# Altium footprint library 方林 封装库.PcbLib: 101 footprints (part 6 of 7)
Each footprint in its own frame and in the unit in brackets; x right, y up, seen from the top. Pads: shape width x height; smd on the part's side, far side on the other; paste and mask are expansions set on the pad; w line width, h text height; cw(c..) or ccw(c..) is an arc to the next point about the centre after c.
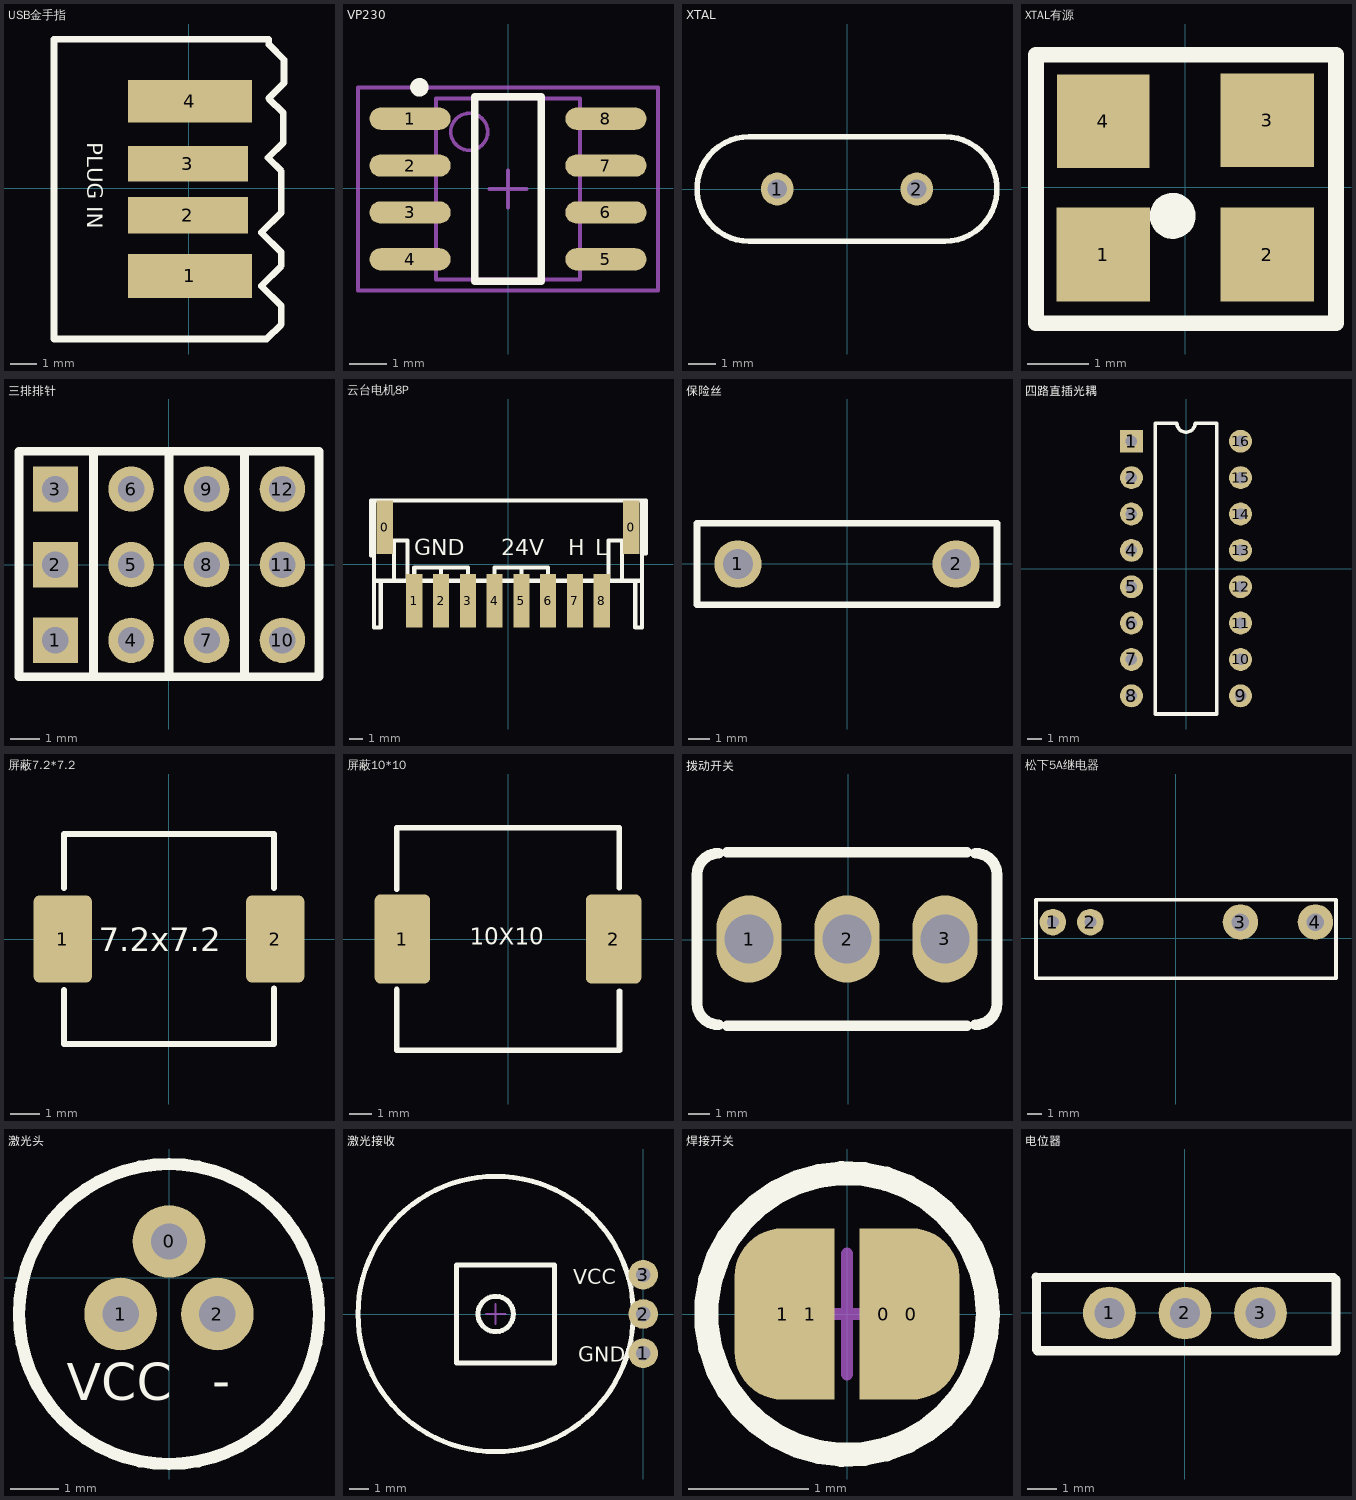
[diagram p5: the footprints below, top view; thin cyan lines are the x and y axes]

## USB金手指 [mil]
pads (4):
  rect 186x66 smd: 1(1.5,-131)
  rect 180x55 smd: 2(-1.5,-40)
  rect 180x53 smd: 3(-1.5,37)
  rect 186x63.58 smd: 4(1.5,131)
Top Overlay:
  lines w10: -202.13,-225.53 -202.13,223.69 119.81,223.69 119.81,215.69 142.5,193 142.5,158 119.5,135 141.5,113 141.5,69 118.5,46 138.5,26 138.5,-36 108.5,-66 138.5,-96 138.5,-116 108.5,-146 138.5,-176 138.5,-196 138.5,-203.53 116.5,-225.53 -201.5,-225.53
  text "PLUG IN" at -160.5,69 h40
3D body: height 11.81, standoff 0, extent -204.5,-228 139.5,-184
3D body: height 11.81, standoff -39.37, extent -203.5,186 145.5,223
3D body: height 39.37, standoff -15.75, extent -204.5,-228 146.5,223

## VP230 [mm]
pads (8):
  oval 2.2x0.6 smd: 1(-2.654,1.88) 2(-2.654,0.61) 3(-2.654,-0.66) 4(-2.654,-1.93) 5(2.654,-1.93) 6(2.654,-0.66) 7(2.654,0.61) 8(2.654,1.88)
Top Overlay:
  circle w0.25: c-2.4,2.73 r0.125
  lines w0.2: -0.9,-2.525 -0.9,2.475 0.9,2.475 0.9,-2.525 -0.9,-2.525
Mechanical 13:
  circle w0.1: c-1.05,1.525 r0.5
  lines w0.1: -1.95,-2.475 -1.95,2.425 1.95,2.425 1.95,-2.475 -1.95,-2.475
Mechanical 15:
  lines w0.1: -0.5,-0.025 0.5,-0.025 ; 0,-0.525 0,0.475 ; -4.064,-2.775 -4.064,2.725 4.064,2.725 4.064,-2.775 -4.064,-2.775
3D body "SO-8.STEP": height 1.7, standoff 0, extent -3,-2.476 3,2.425

## XTAL [mm]
pads (2):
  round 1.2 hole 0.7: 1(-2.54,0) 2(2.54,0)
Top Overlay:
  lines w0.203: -3.556,-1.905 cw(c-3.556,0) -3.556,1.905 3.556,1.905 cw(c3.556,0) 3.556,-1.905 -3.556,-1.905
3D body "CRYSTAL-HP49US.step": height 3.52, standoff -3.98, extent -5.7,-2.286 5.65,2.364

## XTAL有源 [mil]
pads (4):
  rect 60x60 smd: 1(-52.5,-43) 2(52.5,-43) 3(52.5,43)
  rect 59.05x60 smd: 4(-52.5,42.3)
Top Overlay:
  circle w16: c-7.98,-18.2 r6.65
  lines w9.84: -95.5,-87 96.5,-87 ; -95.5,85 96.5,85
  lines w10: -95.5,-87 -95.5,85 ; 96.5,-87 96.5,85
3D body: height 30, standoff 0, extent -95.48,-60.7 99.52,54.3

## 三排排针 [mil]
pads (12):
  rect 60x60 hole 35: 1(-150,-100) 2(-150,0) 3(-150,100)
  round 60 hole 35: 4(-50,-100) 5(-50,0) 6(-50,100) 7(50,-100) 8(50,0) 9(50,100) 10(150,-100) 11(150,0) 12(150,100)
Top Overlay:
  lines w11.81: -99.8,-147.24 -99.8,150 ; 0.1,-148.23 0.1,150 ; 100,-148.23 100,150 ; -198.23,-148.23 198.43,-148.23 198.43,150 -198.23,150 -198.23,-148.23

## 云台电机8P [mm]
pads (10):
  rect 1.2x4 smd: 0(-9.2,2.75) 0(9.2,2.75) 1(-7,-2.75) 2(-5,-2.75) 3(-3,-2.75) 4(-1,-2.75) 5(1,-2.75) 6(3,-2.75) 7(5,-2.75) 8(7,-2.75)
Top Overlay:
  lines w0.305: -10,0.59 -10.051,0.64 -10.227,0.64 -10.227,4.755 -9.648,4.755 ; -9.5,-1.25 -9.5,-4.75 -10,-4.75 -10,-1.25 ; -8.5,-1.25 -8.5,1.75 -7.5,1.75 -7.5,-1.25 ; -7,-1.25 -7,-0.25 -5,-0.25 ; -3,-1.25 -3,-0.25 -5,-0.25 ; -1,-1.25 -1,-0.25 1,-0.25 ; 1,-1.25 1,-0.25 ; 3,-1.25 3,-0.25 1,-0.25 ; 7.5,-1.25 7.5,1.75 8.5,1.75 8.5,-1.25 ; 9.301,4.73 10.296,4.73 10.296,0.793 10.025,0.793 10,0.767 ; 9.5,-1.25 9.5,-4.75 10,-4.75 10,-1.25 ; -10,-1.25 10,-1.25 ; -10,-1.25 -10,4.75 10,4.75 10,-1.25 ; -5,-0.25 -5,-1.25 -5,-0.25
  text "GND" at -7,0.25 h2.03
  text "24V" at -0.5,0.25 h2.03
  text "H" at 4.5,0.25 h2.03
  text "L" at 6.5,0.25 h2.03
3D body: height 2.34, standoff 0, extent 9.728,0.691 10.719,4.603
3D body: height 2.34, standoff 0, extent -10.465,0.615 -9.449,4.654
3D body: height 5.54, standoff 0, extent -8.509,-1.341 -7.442,1.783
3D body: height 5.54, standoff 0, extent 7.544,-1.315 8.56,1.86
3D body: height 2.5, standoff 0, extent 9.55,-4.694 10.058,-1.315
3D body: height 2.5, standoff 0, extent -10.109,-4.77 -9.449,-1.341
3D body: height 5.53, standoff 0, extent -10.109,-1.366 10.058,4.704

## 保险丝 [mm]
pads (2):
  round 2.2 hole 1.397: 1(-5.08,0) 2(5.08,0)
Top Overlay:
  lines w0.305: -6.985,-1.905 -6.985,1.905 6.985,1.905 6.985,-1.905 -6.985,-1.905

## 四路直插光耦 [mm]
pads (16):
  rect 1.6x1.6 hole 0.8: 1(-3.81,8.89)
  round 1.6 hole 0.8: 2(-3.81,6.35) 3(-3.81,3.81) 4(-3.81,1.27) 5(-3.81,-1.27) 6(-3.81,-3.81) 7(-3.81,-6.35) 8(-3.81,-8.89) 9(3.81,-8.89) 10(3.81,-6.35) 11(3.81,-3.81) 12(3.81,-1.27) 13(3.81,1.27) 14(3.81,3.81) 15(3.81,6.35) 16(3.81,8.89)
Top Overlay:
  lines w0.254: -2.159,-10.16 -2.159,10.16 -0.635,10.16 ccw(c0,10.16) 0.635,10.16 2.159,10.16 2.159,-10.16 -2.159,-10.16

## 屏蔽7.2*7.2 [mm]
pads (2):
  rrect20% 2x3 smd: 1(-3.65,0) 2(3.65,0)
Top Overlay:
  lines w0.2: -3.6,-1.75 -3.6,-3.6 3.6,-3.6 3.6,-1.7 ; -3.6,1.75 -3.6,3.6 1.9,3.6 3.6,3.6 3.6,1.75
  text "7.2x7.2" at -2.417,-0.412 h0.81
3D body: height 4, standoff 0.5, extent -3.575,-3.6 3.588,3.588

## 屏蔽10*10 [mm]
pads (2):
  rrect20% 2.5x4 smd: 1(-4.75,0) 2(4.75,0)
Top Overlay:
  lines w0.254: -5,-2.27 -5,-5 5.016,-5 5.016,-2.349 ; -5,2.239 -5,5 5,5 5,2.302
  text "10X10" at -1.719,-0.269 h0.76
3D body: height 5, standoff 0.5, extent -4.978,-4.978 5.004,4.953

## 拨动开关 [mil] "扭子拨动开关"
pads (3):
  oval 120x160 hole 90.55: 1(-182,1) 2(-2,1) 3(178,1)
Top Overlay:
  lines w20: -238.22,-156.48 cw(c-238.22,-117.11) -277.59,-117.11 -277.59,119.11 cw(c-238.22,119.11) -238.22,158.48 ; -222,-158.37 218,-158.37 ; -222,160.37 218,160.37 ; 234.22,-156.48 ccw(c234.22,-117.11) 273.59,-117.11 273.59,119.11 ccw(c234.22,119.11) 234.22,158.48
3D body: height 748.03, standoff 0, extent -41.06,-38.29 37.37,40.29
3D body: height 393.7, standoff 78.74, extent -280,-158 277,162

## 松下5A继电器 [mm]
pads (4):
  round 1.8 hole 0.8: 1(-8.331,1.092) 2(-5.791,1.092)
  round 2.4 hole 1.2: 3(4.369,1.092) 4(9.449,1.092)
Top Overlay:
  lines w0.254: -9.474,-2.718 -9.474,2.616 10.846,2.616 10.846,-2.718 -9.474,-2.718
3D body: height 12.95, standoff 12.7, extent 9.042,-1.321 10.719,0.508
3D body: height 12.95, standoff 12.7, extent -9.487,-2.718 -7.48,-0.94
3D body: height 1.02, standoff 0, extent 9.195,0.838 9.703,1.346
3D body: height 1.02, standoff 0, extent 4.115,0.838 4.623,1.346
3D body: height 1.02, standoff 0, extent -6.045,0.838 -5.537,1.346
3D body: height 1.02, standoff 0, extent -8.585,0.838 -8.077,1.346
3D body: height 12.7, standoff 1.02, extent -9.525,-2.591 10.871,2.54

## 激光头 [mm]
pads (3):
  round 1.5 hole 0.75: 0(0,0.75) 1(-1,-0.75) 2(1,-0.75)
Top Layer:
  lines w0.508: -1,-0.75 -0.707,-0.75
Bottom Layer:
  lines w0.254: 0.599,-0.75 1,-0.75 1.003,-0.75
Top Overlay:
  circle w0.254: c0,-0.75 r3.1
  text "-" at 0.889,-2.503 h0.76
  text "VCC" at -2.108,-2.529 h0.76

## 激光接收 [mm]
pads (3):
  round 1.5 hole 0.75: 1(0,-2) 2(0,0) 3(0,2)
Top Overlay:
  circle w0.254: c-7.5,0 r0.898
  circle w0.254: c-7.5,0 r7
  lines w0.254: -9.5,-2.5 -4.5,-2.5 -4.5,2.5 -9.5,2.5 -9.5,-2.5
  text "VCC" at -3.565,1.509 h0.76
  text "GND" at -3.311,-2.428 h0.76
Mechanical 15:
  lines w0.1: -8,0 -7,0 ; -7.5,-0.5 -7.5,0.5

## 焊接开关 [mil]
pads (4):
  rect 15.75x56 smd: 0(12,0) 1(-12,0)
  rrect100% 31.5x56 smd: 0(21,0) 1(-21,0)
Top Overlay:
  circle w7.87: c0,0 r46.01
Mechanical 15:
  lines w3.94: -19.68,0 19.69,0 ; 0,-19.68 0,19.69

## 电位器 [mil]
pads (3):
  round 70 hole 40: 1(-100,0) 2(0,0) 3(100,0)
Top Overlay:
  lines w12: -197.24,47.24 -196.85,46.85 ; -196.85,46.85 196.85,46.85 200,43.7 200,-50 -195,-50 -196.85,-48.15 -196.85,46.85
3D body: height 433.07, standoff 19.68, extent -178.35,-18.34 -139.13,20.95
3D body: height 393.7, standoff 19.68, extent -177.5,-50 172.5,50
3D body: height 393.7, standoff 0, extent 172.5,-50 197.5,50
3D body: height 393.7, standoff 0, extent -202.5,-50 -177.5,50